# Altium footprint library Kon_Tipk.PCBLIB: 113 footprints (part 6 of 8)
Each footprint in its own frame and in the unit in brackets; x right, y up, seen from the top. Pads: shape width x height; smd on the part's side, far side on the other; paste and mask are expansions set on the pad; w line width, h text height; cw(c..) or ccw(c..) is an arc to the next point about the centre after c.
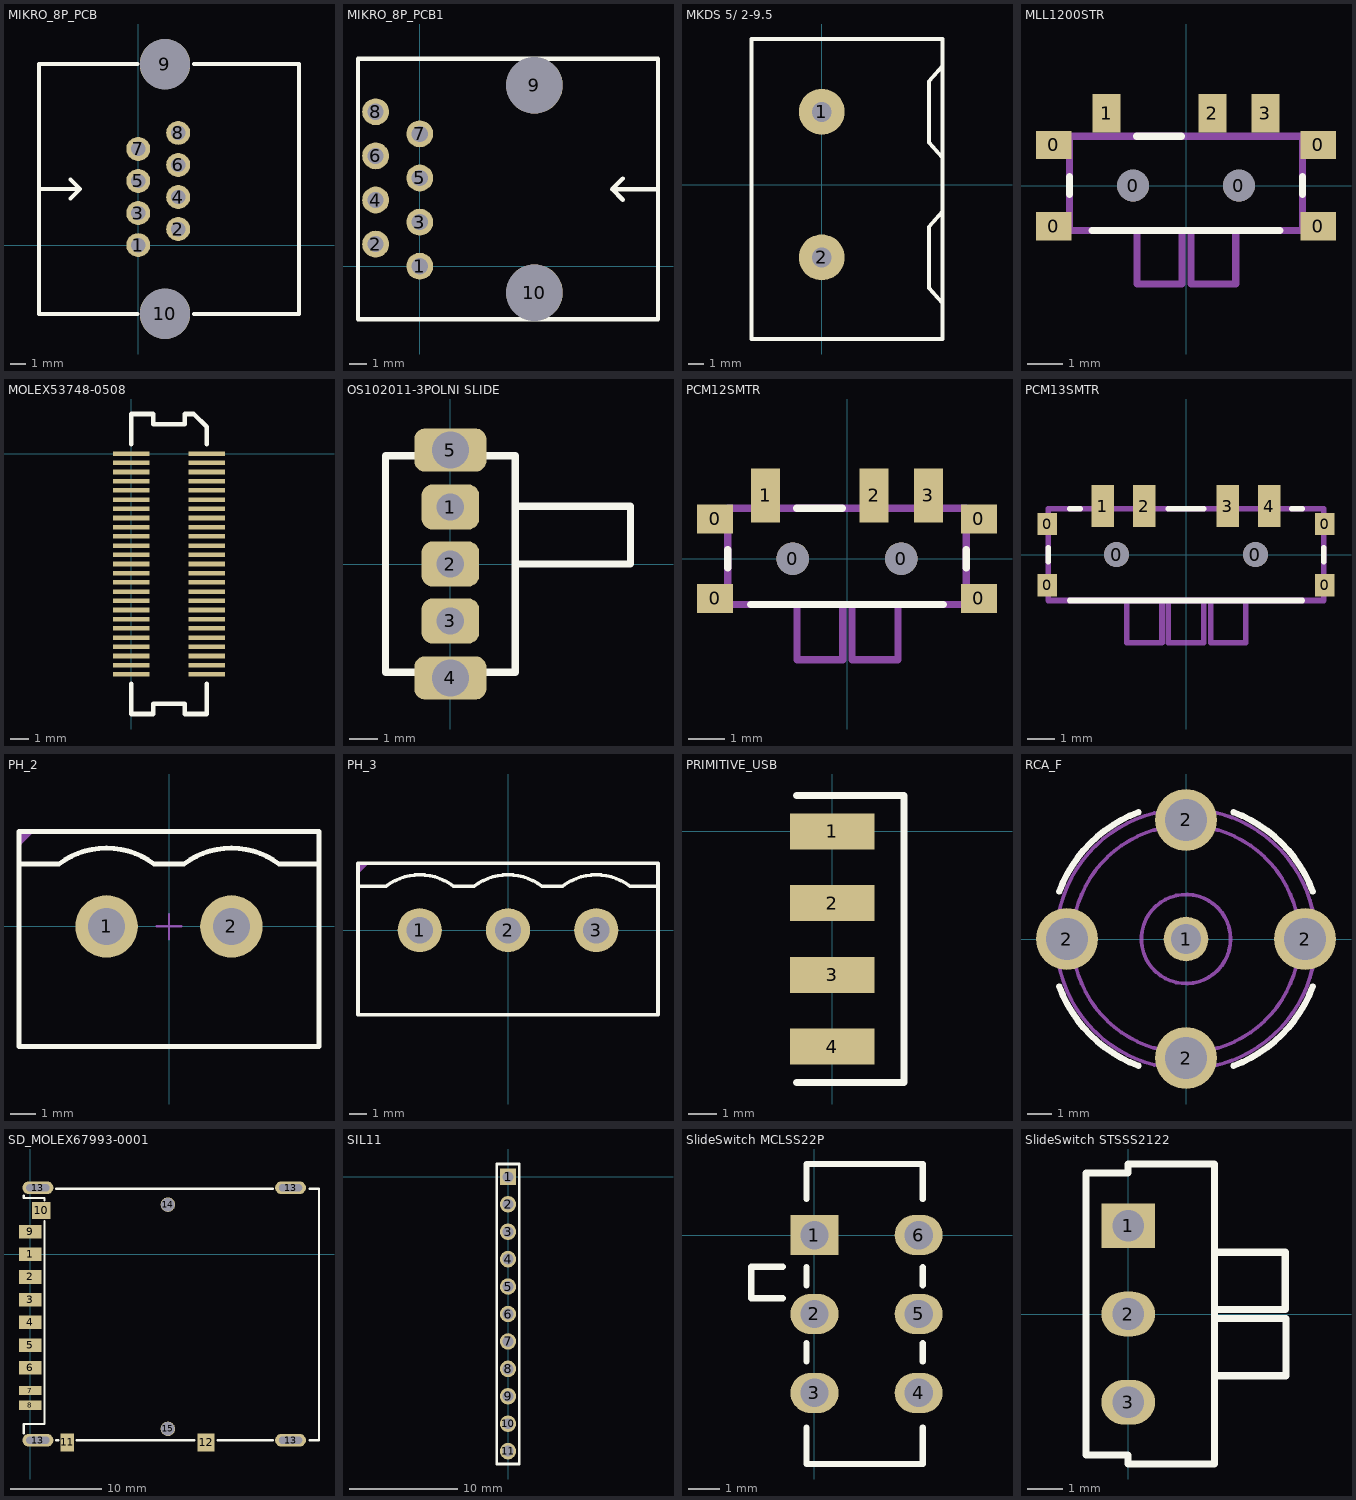
[diagram p5: the footprints below, top view; thin cyan lines are the x and y axes]

## MIKRO_8P_PCB [mil]
pads (10):
  round 60 hole 36: 1(0,0) 2(100,40.16) 3(0,80.31) 4(100,120.47) 5(0,160.63) 6(100,200.79) 7(0,240.94) 8(100,281.1)
  round 126 hole 126 unplated: 9(66.93,453.15) 10(66.93,-172.05)
Top Overlay:
  lines w10: -248.03,140.94 -146.06,140.94 ; -169.69,117.32 -146.06,140.94 ; -169.69,164.57 -146.06,140.94 ; -2.36,-172.05 -248.03,-172.05 -248.03,453.15 -2.36,453.15 ; 139.37,-172.05 401.97,-172.05 401.97,453.15 139.37,453.15

## MIKRO_8P_PCB1 [mil]
pads (10):
  round 60 hole 36: 1(0,0) 2(-98.43,49.21) 3(0,98.43) 4(-98.43,147.64) 5(0,196.85) 6(-98.43,246.06) 7(0,295.28) 8(-98.43,344.49)
  round 126 hole 126 unplated: 9(255.91,403.54) 10(255.91,-59.06)
Top Overlay:
  lines w10: 453.15,148.43 429.53,172.05 ; 453.15,195.67 429.53,172.05 ; 531.5,172.05 429.53,172.05 ; -137.8,-118.11 531.5,-118.11 531.5,462.6 -137.8,462.6 -137.8,-118.11

## MKDS 5/ 2-9.5 [mm]
height 21.5
pads (2):
  round 3 hole 1.3: 1(0,4.76) 2(0,-4.76)
Top Overlay:
  lines w0.254: 7.897,-7.76 7,-6.76 7,-4.76 7,-2.76 7.897,-1.76 ; 7.897,1.76 7,2.76 7,4.76 7,6.76 7.897,7.76 ; -4.6,-10.089 -4.6,9.519 7.897,9.519 7.897,-10.089 -4.6,-10.089
3D body: height 0.25, standoff 0, extent -6.378,0.604 -6.378,0.604
3D body "1714971_03.stp": height 21.51, standoff -4.99, extent -4.6,-10.09 7.9,9.52

## MLL1200STR [mm] "TE slide switch"
height 1.4
pads (9):
  rect 1x0.8 smd: 0(-3.75,-1.15) 0(-3.75,1.15) 0(3.75,-1.15) 0(3.75,1.15)
  round 0.9 hole 0.9 unplated: 0(-1.5,0) 0(1.5,0)
  rect 0.8x1.1 smd: 1(-2.25,2.05) 2(0.75,2.05) 3(2.25,2.05)
Top Overlay:
  lines w0.2: -3.302,-0.254 -3.302,0.254 ; -2.667,-1.27 2.667,-1.27 ; -1.397,1.397 -0.127,1.397 ; 3.302,-0.254 3.302,0.254
Mechanical 13:
  lines w0.2: -1.385,-1.27 -1.385,-2.794 -0.115,-2.794 -0.115,-1.27 ; 0.139,-1.27 0.139,-2.794 1.409,-2.794 1.409,-1.27 ; -3.302,-1.27 -3.302,1.397 3.302,1.397 3.302,-1.27 -3.302,-1.27
3D body "c-1437575-2-a-3d.stp": height 1.41, standoff -0.49, extent -3.85,-2.57 3.85,2.23

## MOLEX53748-0508 [mm]
pads (50):
  rect 2x0.25 smd: 1(0,0) 2(4.1,0) 3(0,-0.5) 4(4.1,-0.5) 5(0,-1) 6(4.1,-1) 7(0,-1.5) 8(4.1,-1.5) 9(0,-2) 10(4.1,-2) 11(0,-2.5) 12(4.1,-2.5) 13(0,-3) 14(4.1,-3) 15(0,-3.5) 16(4.1,-3.5) 17(0,-4) 18(4.1,-4) 19(0,-4.5) 20(4.1,-4.5) 21(0,-5) 22(4.1,-5) 23(0,-5.5) 24(4.1,-5.5) 25(0,-6) 26(4.1,-6) 27(0,-6.5) 28(4.1,-6.5) 29(0,-7) 30(4.1,-7) 31(0,-7.5) 32(4.1,-7.5) 33(0,-8) 34(4.1,-8) 35(0,-8.5) 36(4.1,-8.5) 37(0,-9) 38(4.1,-9) 39(0,-9.5) 40(4.1,-9.5) 41(0,-10) 42(4.1,-10) 43(0,-10.5) 44(4.1,-10.5) 45(0,-11) 46(4.1,-11) 47(0,-11.5) 48(4.1,-11.5) 49(0,-12) 50(4.1,-12)
Top Overlay:
  lines w0.254: 0,-12.5 0,-14.15 1.2,-14.15 1.2,-13.6 2.9,-13.6 2.9,-14.15 4.1,-14.15 4.1,-12.5 ; 0,0.5 0,2.15 1.2,2.15 1.2,1.6 2.9,1.6 2.9,2.15 3.4,2.15 4.1,1.45 4.1,0.5

## OS102011-3POLNI SLIDE [mil]
pads (5):
  rrect50% 80x63 hole 38: 1(0,79) 2(0,0) 3(0,-79)
  rrect50% 100x60 hole 51.18: 4(0,-158) 5(0,158)
Top Overlay:
  lines w10: -50,-150 -90,-150 -90,150 -50,150 ; 50,-150 90,-150 90,150 50,150 ; 90,0 250,0 250,80 90,80

## PCM12SMTR [mm] "C&K components slide switch"
height 1.4
pads (9):
  rect 1x0.8 smd: 0(-3.65,-1.1) 0(-3.65,1.1) 0(3.65,-1.1) 0(3.65,1.1)
  round 0.9 hole 0.9 unplated: 0(-1.5,0) 0(1.5,0)
  rect 0.8x1.5 smd: 1(-2.25,1.75) 2(0.75,1.75) 3(2.25,1.75)
Top Overlay:
  lines w0.2: -3.302,-0.254 -3.302,0.254 ; -2.667,-1.27 2.667,-1.27 ; -1.397,1.397 -0.127,1.397 ; 3.302,-0.254 3.302,0.254
Mechanical 13:
  lines w0.2: -1.385,-1.27 -1.385,-2.794 -0.115,-2.794 -0.115,-1.27 ; 0.139,-1.27 0.139,-2.794 1.409,-2.794 1.409,-1.27 ; -3.302,-1.27 -3.302,1.397 3.302,1.397 3.302,-1.27 -3.302,-1.27
3D body "c-1437575-2-a-3d.stp": height 1.41, standoff -0.49, extent -3.85,-2.57 3.85,2.23

## PCM13SMTR [mm] "C&K components slide switch"
height 1.4
pads (10):
  rect 0.7x0.8 smd: 0(-5,-1.1) 0(-5,1.1) 0(5,-1.1) 0(5,1.1)
  round 0.9 hole 0.9 unplated: 0(-2.5,0) 0(2.5,0)
  rect 0.8x1.5 smd: 1(-3,1.75) 2(-1.5,1.75) 3(1.5,1.75) 4(3,1.75)
Top Overlay:
  lines w0.2: -4.953,-0.254 -4.953,0.254 ; -4.191,-1.651 4.191,-1.651 ; -4.191,1.651 -3.81,1.651 ; -0.635,1.651 0.635,1.651 ; 3.81,1.651 4.191,1.651 ; 4.953,-0.254 4.953,0.254
Mechanical 13:
  lines w0.2: -2.135,-1.651 -2.135,-3.175 -0.865,-3.175 -0.865,-1.651 ; -0.635,-1.651 -0.635,-3.175 0.635,-3.175 0.635,-1.651 ; 0.889,-1.651 0.889,-3.175 2.159,-3.175 2.159,-1.651 ; -4.953,-1.651 -4.953,1.651 4.953,1.651 4.953,-1.651 -4.953,-1.651
3D body: height 1.4, standoff 0, extent -4.952,-1.65 4.952,1.65
3D body: height 1.4, standoff 0, extent -2.134,-3.174 -0.866,-1.652

## PH_2 [mm]
pads (2):
  round 2.5 hole 1.5: 1(-2.5,0) 2(2.5,0)
Top Overlay:
  lines w0.2: -6,2.5 -5,2.5 -4.4,2.5 cw(c-2.5,0) -0.6,2.5 0,2.5 0.6,2.5 cw(c2.5,0) 4.4,2.5 5,2.5 6,2.5 ; 6,2.5 6,3.8 -6,3.8 -6,0 -6,-4.8 6,-4.8 6,2.5
Mechanical 13:
  region: -6,3.2 -5.4,3.8 -6,3.8
  lines w0.05: -6,2.5 -5,2.5 -4.4,2.5 cw(c-2.5,0) -0.6,2.5 0,2.5 0.6,2.5 cw(c2.5,0) 4.4,2.5 5,2.5 6,2.5 ; -6,-4.8 -6,0 -6,3.8 6,3.8 6,-4.8 -6,-4.8
  text ".Designator" at -4.1,-1.6 h2
Bottom Courtyard:
  circle w0.254: c-2.5,0 r0.8
  circle w0.254: c2.5,0 r0.8
  lines w0.1: -0.5,0 0.5,0 ; 0,-0.5 0,0.5
Mechanical 29:
  text "1" at -3.9,-0.2 h1
3D body "1924198.stp": height 12, standoff -3.9, extent -6,-4.8 6,3.8

## PH_3 [mm]
pads (3):
  round 2.5 hole 1.5: 1(-5,0) 2(0,0) 3(5,0)
Top Overlay:
  lines w0.2: -8.5,2.5 -7.5,2.5 -6.9,2.5 cw(c-5,0) -3.1,2.5 -2.5,2.5 -1.9,2.5 cw(c0,0) 1.9,2.5 3.1,2.5 cw(c5,0) 6.9,2.5 7.5,2.5 8.5,2.5 ; 8.5,2.5 8.5,3.8 -8.5,3.8 -8.5,0 -8.5,-4.8 8.5,-4.8 8.5,2.5
Mechanical 13:
  region: -8.5,3.2 -7.9,3.8 -8.5,3.8
  lines w0.05: -8.5,2.5 -7.5,2.5 -6.9,2.5 cw(c-5,0) -3.1,2.5 -2.5,2.5 -1.9,2.5 cw(c0,0) 1.9,2.5 2.5,2.5 3.1,2.5 cw(c5,0) 6.9,2.5 8.5,2.5 ; -8.5,-4.8 -8.5,0 -8.5,3.8 8.5,3.8 8.5,-4.8 -8.5,-4.8
  text ".Designator" at -4.8,-1.5 h2
Bottom Courtyard:
  circle w0.254: c5,0 r0.8
  circle w0.254: c0,0 r0.8
  circle w0.254: c-5,0 r0.8
Mechanical 29:
  text "1" at -6.4,-0.2 h1
3D body "1924208.stp": height 12, standoff -3.9, extent -8.5,-4.8 8.5,3.8

## PRIMITIVE_USB [mm]
pads (4):
  rect 3x1.27 smd: 1(0,0) 2(0,-2.54) 3(0,-5.08) 4(0,-7.62)
Top Overlay:
  lines w0.254: -1.27,-8.89 2.54,-8.89 2.54,1.27 -1.27,1.27

## RCA_F [mm] "RCA connector, female, vertical, Lumberg btor1"
height 17
pads (5):
  round 1.8 hole 1.2: 1(0,0)
  round 2.5 hole 1.7: 2(-4.8,0) 2(0,-4.8) 2(0,4.8) 2(4.8,0)
Top Overlay:
  lines w0.254: -5.115,-1.918 ccw(c0,0) -1.918,-5.115 ; -5.115,1.918 cw(c0,0) -1.918,5.115 ; 1.918,-5.115 ccw(c0,0) 5.115,-1.918 ; 1.918,5.115 cw(c0,0) 5.115,1.918
Mechanical 13:
  circle w0.15: c0,0 r1.796
  circle w0.15: c0,0 r4.579
  circle w0.15: c0,0 r5.236
Top Courtyard:
  circle w0.15: c0,0 r5.236
  lines w0.1: -0.5,0 0.5,0 ; 0,-0.5 0,0.5
3D body: height 17, standoff 0, extent -4.579,-4.579 4.579,4.579
3D body: height 8.5, standoff 0, extent -5.236,-5.236 5.236,5.236

## SD_MOLEX67993-0001 [mm]
pads (18):
  rect 2.5x1.5 smd: 1(0,-0.001) 2(0,-2.501) 3(0,-5.001) 4(0,-7.501) 5(0,-10.001) 6(0,-12.501) 9(0,2.499)
  rect 2.5x1 smd: 7(0,-15.001) 8(0,-16.626)
  rect 2x1.9 smd: 10(1.2,4.824)
  rect 1.5x2 smd: 11(4.08,-20.726)
  rect 1.9x2 smd: 12(19.35,-20.726)
  oval 3.4x1.4 hole 0.8 slot 2.54 at 0 deg: 13(0.83,-20.476) 13(0.83,7.324) 13(28.65,-20.476) 13(28.65,7.324)
  round 1.6 hole 1.5 unplated: 14(15.15,5.474) 15(15.15,-19.226)
Top Overlay:
  lines w0.254: -0.726,-19.704 -0.726,-18.688 1.56,-18.688 1.56,3.664 ; -0.726,6.458 -0.726,6.204 1.56,6.204 1.56,5.95 ; 2.83,-20.466 3.084,-20.466 ; 2.83,7.22 26.706,7.22 ; 5.116,-20.466 18.07,-20.466 ; 20.61,-20.466 26.706,-20.466 ; 30.77,-20.466 31.786,-20.466 31.786,7.22 30.77,7.22

## SIL11 [mil]
pads (11):
  rect 60x60 hole 39.37: 1(0,0)
  round 60 hole 39.37: 2(0,-100) 3(0,-200) 4(0,-300) 5(0,-400) 6(0,-500) 7(0,-600) 8(0,-700) 9(0,-800) 10(0,-900) 11(0,-1000)
Top Overlay:
  lines w10: -40.94,-1046.85 40.94,-1046.85 40.94,46.85 -40.94,46.85 -40.94,-1046.85

## SlideSwitch MCLSS22P [mm]
pads (6):
  rect 1.52x1.27 hole 0.9: 1(0,0)
  oval 1.52x1.27 hole 0.9: 2(0,-2.5) 3(0,-5) 4(3.3,-5) 5(3.3,-2.5) 6(3.3,0)
Top Overlay:
  lines w0.2: -1,-2 -2,-2 -2,-1 -1,-1 ; -0.254,-6.096 -0.254,-7.25 3.429,-7.25 3.429,-6.096 ; -0.254,-4.006 -0.254,-3.429 ; -0.254,-1.593 -0.254,-1.016 ; -0.254,1.143 -0.254,2.25 3.429,2.25 3.429,1.143 ; 3.429,-4.006 3.429,-3.429 ; 3.429,-1.593 3.429,-1.016

## SlideSwitch STSSS2122 [mm]
pads (3):
  rect 1.52x1.27 hole 0.9: 1(0,2.5)
  oval 1.52x1.27 hole 0.9: 2(0,0) 3(0,-2.5)
Top Overlay:
  lines w0.2: 2.45,-1.75 4.475,-1.75 4.475,-0.125 2.475,-0.125 ; 2.45,0.125 4.45,0.125 4.45,1.75 2.45,1.75 ; -1.2,-4 -1.2,4 0,4 0,4.25 2.45,4.25 2.45,-4.25 0,-4.25 0,-4 -1.2,-4